# Altium footprint library PCB1.PcbLib: 54 footprints (part 1 of 4)
Each footprint in its own frame and in the unit in brackets; x right, y up, seen from the top. Pads: shape width x height; smd on the part's side, far side on the other; paste and mask are expansions set on the pad; w line width, h text height; cw(c..) or ccw(c..) is an arc to the next point about the centre after c.
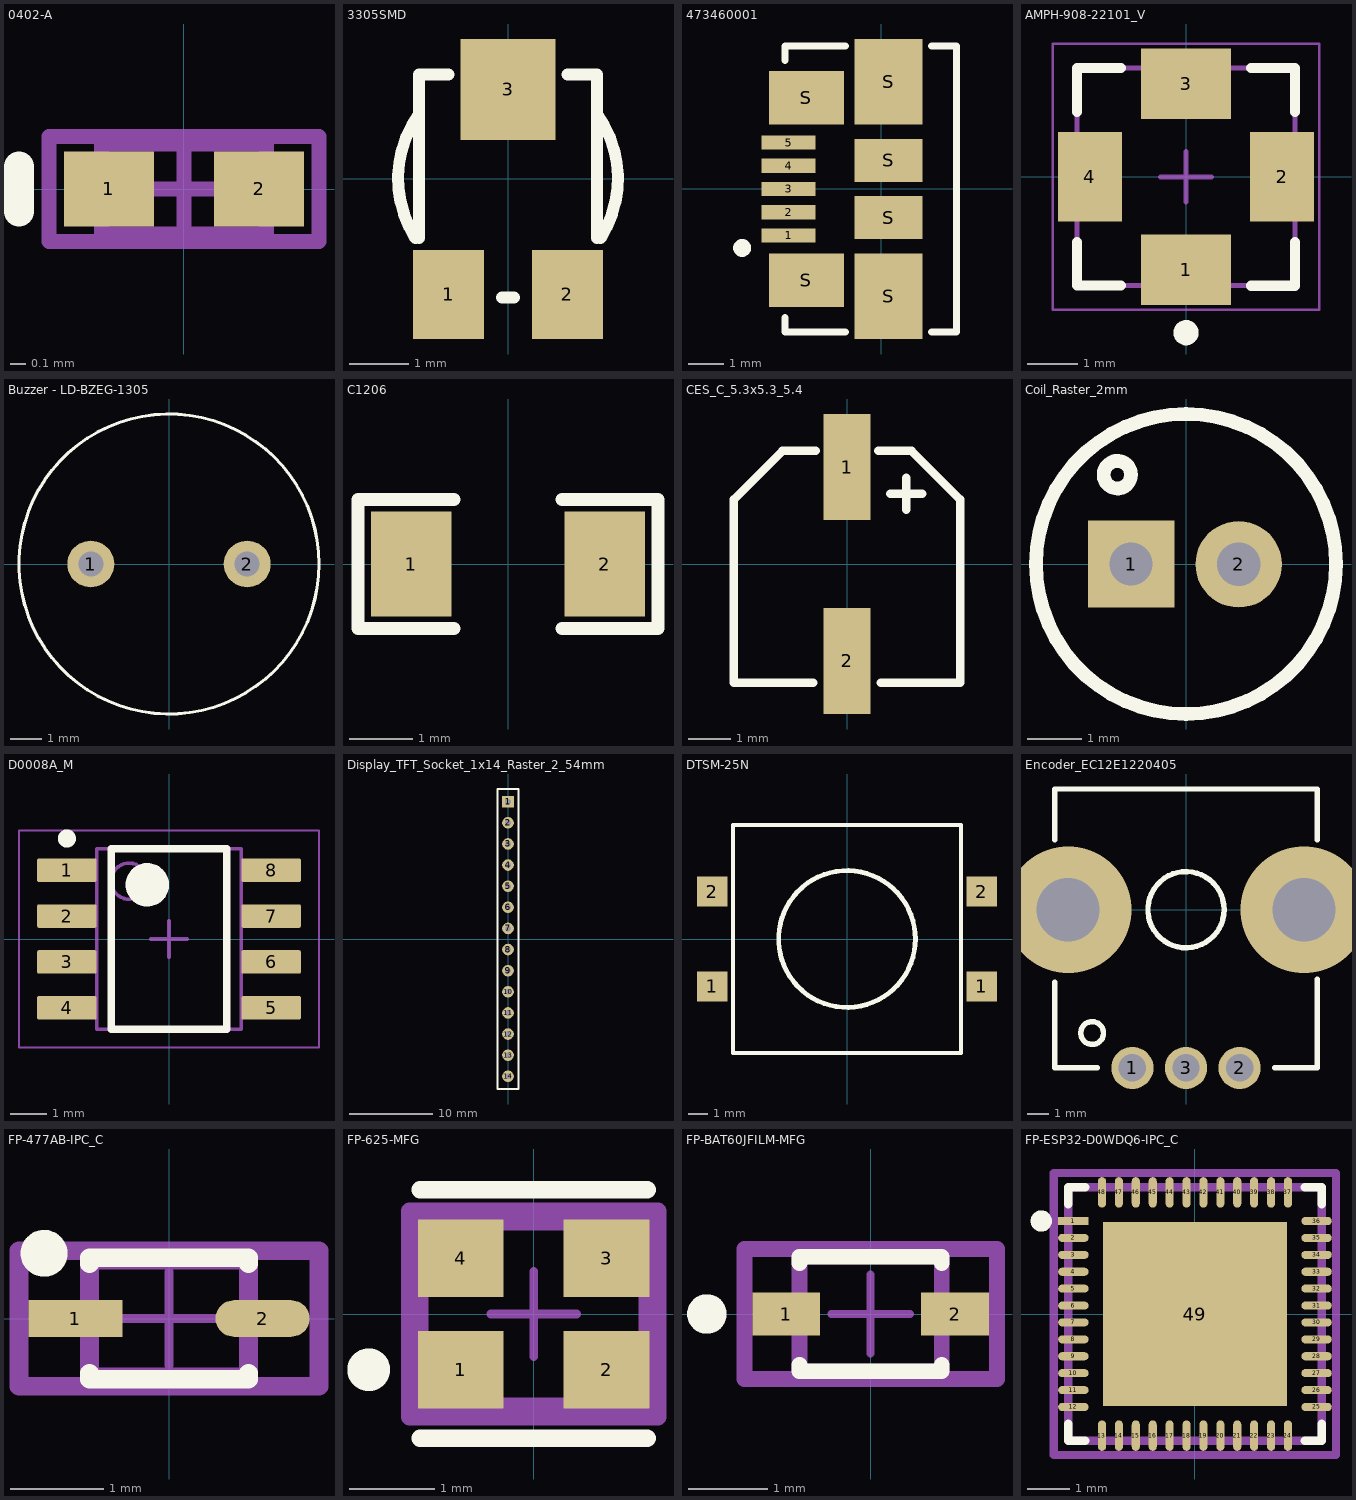
[diagram p0: the footprints below, top view; thin cyan lines are the x and y axes]

## 0402-A [mm]
pads (2):
  rect 0.6x0.5 smd: 1(-0.5,0) 2(0.5,0)
Top Overlay:
  lines w0.2: -1.1,-0.15 -1.1,0.15
Mechanical 13:
  lines w0.1: -0.55,-0.3 0.55,-0.3 0.55,0.3 -0.55,0.3 -0.55,-0.3
Mechanical 15:
  lines w0.1: -0.3,0 0.3,0 ; 0,-0.3 0,0.3 ; -0.9,-0.35 0.9,-0.35 0.9,0.35 -0.9,0.35 -0.9,-0.35
3D body: height 0.55, standoff 0, extent -0.55,-0.3 0.55,0.3

## 3305SMD [mm]
pads (3):
  rect 1.2x1.5 smd: 1(-1,-1.95) 2(1,-1.95)
  rect 1.6x1.7 smd: 3(0,1.5)
Top Overlay:
  lines w0.2: -1.558,-0.998 cw(c0,0) -1.504,1.078 ; -1.5,-1 -1.5,0.9 -1.5,1.75 -1,1.75 ; -0.1,-2 0.1,-2 ; 1,1.75 1.5,1.75 1.5,0.9 1.5,-1 ; 1.504,1.078 cw(c0,0) 1.558,-0.998
3D body: height 0.4, standoff 0, extent -1.5,-2 1.5,1.75
3D body: height 1.2, standoff 0.4, extent -1.85,-1.847 1.85,1.847

## 473460001 [mm]
pads (11):
  rect 1.5x0.4 smd: 1(-2.6,-1.3) 2(-2.6,-0.65) 3(-2.6,0) 4(-2.6,0.65) 5(-2.6,1.3)
  rect 2.1x1.5 smd: S(-2.1,-2.55) S(-2.1,2.55)
  rect 1.9x2.4 smd: S(0.2,-3) S(0.2,3)
  rect 1.9x1.2 smd: S(0.2,-0.8) S(0.2,0.8)
Top Overlay:
  circle w0.25: c-3.9,-1.65 r0.125
  lines w0.2: -2.7,-3.6 -2.7,-4 -1,-4 ; -2.7,3.6 -2.7,4 -1,4 ; 1.4,-4 2.1,-4 2.1,4 1.4,4
Mechanical 1:
  lines w0.1: 2.1,-4 2.1,4
  text "PCB Edge" at 3.1,-3.1 h0.8
3D body "473460001.stp": height 2.72, standoff -0.22, extent -2.65,-3.99 2.78,3.99

## AMPH-908-22101_V [mil]
pads (4):
  rect 70x55 smd paste-39.37: 1(0,-72.5) 3(0,72.5)
  rect 50x70 smd paste-39.37: 2(75,0) 4(-75,0)
Top Overlay:
  circle w9.84: c0,-121.65 r4.92
  lines w7.87: -85.04,-50.75 -85.04,-84.96 -50.75,-84.96 ; -84.99,50.75 -84.99,85 -50.75,85 ; 50.75,-85.04 84.96,-85.04 84.96,-50.75 ; 50.75,85 85,85 85,50.75
Mechanical 13:
  lines w3.94: -85,-85 -85,85 85,85 85,-85 -85,-85
Mechanical 15:
  lines w1.97: -103.92,-103.94 -103.92,103.94 103.92,103.94 103.92,-103.94 -103.92,-103.94
  lines w3.94: -19.68,0 19.68,0 ; 0,-19.68 0,19.68
3D body "908-22101.stp": height 142.56, standoff 0.5, extent -84.99,-84.99 85.05,85

## Buzzer - LD-BZEG-1305 [mm]
pads (2):
  round 1.5 hole 0.8 paste+0 mask+0.03: 1(-2.5,0) 2(2.5,0)
Top Overlay:
  circle w0.1: c0,0 r4.8
3D body: height 5, standoff 0, extent -4.8,-4.797 4.8,4.797
3D body: height 0.4, standoff -1, extent 2.102,-0.399 2.898,0.399
3D body: height 0.4, standoff -1, extent -2.898,-0.399 -2.102,0.399

## C1206 [mil]
pads (2):
  rect 50x65 smd: 1(-60,0) 2(60,0)
Top Overlay:
  lines w7.87: -33.46,-40 -93,-40 -93,40 -33.46,40 ; 33.46,-40 92.91,-40 92.91,40 33.46,40
3D body "User Library-1206 SMD Capacitor.step": height 39.45, standoff 0, extent -62.99,-31.49 63,31.5

## CES_C_5.3x5.3_5.4 [mm]
pads (2):
  rect 1.1x2.5 smd: 1(0,2.286) 2(0,-2.286)
Top Overlay:
  lines w0.2: -0.8,-2.794 -2.667,-2.794 -2.667,1.524 -1.524,2.667 -0.742,2.667 ; 0.742,2.667 1.524,2.667 2.667,1.524 2.667,-2.794 0.8,-2.794 ; 1.024,1.651 1.778,1.651 ; 1.397,1.278 1.397,2.032
3D body "User Library-ALU-C.STEP": height 5.41, standoff 0, extent -2.65,-2.95 2.65,2.95

## Coil_Raster_2mm [mm]
pads (2):
  rect 1.6x1.6 hole 0.8: 1(-1.016,0)
  round 1.6 hole 0.8: 2(0.974,-0.005)
Top Overlay:
  circle w0.254: c-1.27,1.651 r0.254
  circle w0.254: c0,0 r2.774
3D body: height 0, standoff -16, extent 0.649,-0.33 1.299,0.32
3D body: height 0, standoff -16, extent -1.341,-0.325 -0.691,0.325
3D body: height 7.5, standoff 0, extent -2.794,-0.572 -2.667,0.826
3D body: height 7.5, standoff 0, extent -2.75,-2.75 2.75,2.75

## D0008A_M [mm]
pads (8):
  rrect15% 1.65x0.65 smd: 1(-2.825,1.905) 2(-2.825,0.635) 3(-2.825,-0.635) 4(-2.825,-1.905) 5(2.825,-1.905) 6(2.825,-0.635) 7(2.825,0.635) 8(2.825,1.905)
Top Overlay:
  circle w0.25: c-2.825,2.78 r0.125
  circle w0.6: c-0.6,1.5 r0.3
  lines w0.2: -1.6,-2.5 -1.6,2.5 1.6,2.5 1.6,-2.5 -1.6,-2.5
Mechanical 1:
  text ".Designator" at -1.397,-0.254 h0.6
Mechanical 13:
  circle w0.1: c-1.1,1.6 r0.5
  lines w0.1: -2,-2.5 -2,2.5 2,2.5 2,-2.5 -2,-2.5
Mechanical 15:
  lines w0.05: -4.15,-3 -4.15,3 4.15,3 4.15,-3 -4.15,-3
  lines w0.1: -0.5,0 0.5,0 ; 0,-0.5 0,0.5
3D body "SOIC-8akaD0008AakaM08A.stp": height 1.63, standoff 0, extent -3,-2.45 3,2.45

## Display_TFT_Socket_1x14_Raster_2_54mm [mm]
pads (14):
  rect 1.4x1.4 hole 0.7: 1(0,16.51)
  round 1.4 hole 0.7: 2(0,13.97) 3(0,11.43) 4(0,8.89) 5(0,6.35) 6(0,3.81) 7(0,1.27) 8(0,-1.27) 9(0,-3.81) 10(0,-6.35) 11(0,-8.89) 12(0,-11.43) 13(0,-13.97) 14(0,-16.51)
Top Overlay:
  lines w0.254: -1.27,-18.034 1.27,-18.034 1.27,18.034 -1.27,18.034 -1.27,-18.034
3D body: height 8.5, standoff 0, extent -1.27,14.859 1.27,15.621
3D body: height 8.5, standoff 0, extent -1.27,12.319 1.27,13.081
3D body: height 8.5, standoff 0, extent -1.27,9.779 1.27,10.541
3D body: height 8.5, standoff 0, extent -1.27,7.239 1.27,8.001
3D body: height 8.5, standoff 0, extent -1.27,4.699 1.27,5.461
3D body: height 8.5, standoff 0, extent -1.27,2.159 1.27,2.921
3D body: height 8.5, standoff 0, extent -1.27,-0.381 1.27,0.381
3D body: height 8.5, standoff 0, extent -1.27,-2.921 1.27,-2.159
3D body: height 8.5, standoff 0, extent -1.27,-5.461 1.27,-4.699
3D body: height 8.5, standoff 0, extent -1.27,-8.001 1.27,-7.239
3D body: height 8.5, standoff 0, extent -1.27,-10.541 1.27,-9.779
3D body: height 8.5, standoff 0, extent -1.27,-13.081 1.27,-12.319
3D body: height 8.5, standoff 0, extent -1.27,-15.621 1.27,-14.859
3D body: height 0.5, standoff 0, extent -1.27,-18.034 1.27,18.034
3D body: height 8.5, standoff 0, extent -1.27,-18.034 1.27,-17.272
3D body: height 8.5, standoff 0, extent -1.27,17.399 1.27,18.034
3D body: height 8.5, standoff 0, extent -1.27,-18.034 -0.635,18.034
3D body: height 8.5, standoff 0, extent 0.635,-18.034 1.27,18.034
3D body: height 0, standoff -3, extent -0.4,-16.91 0.4,-16.11
3D body: height 0, standoff -3, extent -0.4,-14.37 0.4,-13.57
3D body: height 0, standoff -3, extent -0.4,-11.83 0.4,-11.03
3D body: height 0, standoff -3, extent -0.4,-9.29 0.4,-8.49
3D body: height 0, standoff -3, extent -0.4,-6.75 0.4,-5.95
3D body: height 0, standoff -3, extent -0.4,-4.21 0.4,-3.41
3D body: height 0, standoff -3, extent -0.4,-1.67 0.4,-0.87
3D body: height 0, standoff -3, extent -0.4,3.41 0.4,4.21
3D body: height 0, standoff -3, extent -0.4,5.95 0.4,6.75
3D body: height 0, standoff -3, extent -0.4,8.49 0.4,9.29
3D body: height 0, standoff -3, extent -0.4,11.03 0.4,11.83
3D body: height 0, standoff -3, extent -0.4,13.57 0.4,14.37
3D body: height 0, standoff -3, extent -0.4,16.11 0.4,16.91

## DTSM-25N [mm]
pads (4):
  rect 1.6x1.6 smd: 1(-7.1,-2.5) 1(7.1,-2.5) 2(-7.1,2.5) 2(7.1,2.5)
Top Overlay:
  circle w0.254: c0,0 r3.601
  lines w0.229: -6,-6 -6,6 6,6 6,-6 -6,-6
3D body "Diptronics_DTSM25_BROWN.STEP": height 8.5, standoff 0, extent -7.5,-6 7.5,6

## Encoder_EC12E1220405 [mm]
pads (3):
  round 2 hole 1.3: 1(-2.54,-7.493) 2(2.54,-7.493) 3(0,-7.493)
via -5.588,0 diameter 6 hole 3
via 5.588,0 diameter 6 hole 3
Top Overlay:
  circle w0.254: c0,0 r1.805
  circle w0.254: c-4.445,-5.842 r0.539
  lines w0.254: -6.223,-3.429 -6.223,-7.493 -4.191,-7.493 ; -6.223,3.302 -6.223,5.715 -1.778,5.715 6.223,5.715 6.223,3.302 ; 4.191,-7.493 6.223,-7.493 6.223,-3.302
3D body "ec12e1220405.stp": height 24.7, standoff -3.8, extent -6.996,-7.65 6.996,6.6

## FP-477AB-IPC_C [mm]
pads (2):
  rect 1.006x0.392 smd paste+0 mask+0: 1(-1,0)
  rrect100% 1.006x0.392 smd paste+0 mask+0: 2(1,0)
Top Overlay:
  circle w0.25: c-1.335,0.696 r0.125
  lines w0.2: -0.85,-0.585 -0.85,-0.65 0.85,-0.65 0.85,-0.585 ; -0.85,0.585 -0.85,0.65 0.85,0.65 0.85,0.585
Top 3D Body:
  lines w0.2: -0.85,-0.625 -0.85,0.625 0.85,0.625 0.85,-0.625 -0.85,-0.625
Top Courtyard:
  lines w0.2: -1.603,-0.725 -1.603,0.725 1.603,0.725 1.603,-0.725 -1.603,-0.725
Top Assembly:
  lines w0.2: -1.603,-0.725 -1.603,0.725 1.603,0.725 1.603,-0.725 -1.603,-0.725
  text ".Designator" at 0,0.188 h1
Top Component Center:
  lines w0.1: -0.5,0 0.5,0 ; 0,-0.5 0,0.5
3D body "Diode_ON_Semiconductor_1N4148WS_eec.STEP": height 0.25, standoff 0, extent -1.603,-0.725 1.603,0.725

## FP-625-MFG [mm]
pads (4):
  rect 1x0.9 smd paste+0 mask+0: 1(-0.85,-0.65) 2(0.85,-0.65) 3(0.85,0.65) 4(-0.85,0.65)
Top Overlay:
  circle w0.25: c-1.925,-0.65 r0.125
  lines w0.2: -1.325,-1.45 1.325,-1.45 ; -1.325,1.45 1.325,1.45
Top 3D Body:
  lines w0.2: -1.325,-1.075 -1.325,1.075 1.325,1.075 1.325,-1.075 -1.325,-1.075
Top Courtyard:
  lines w0.2: -1.45,-1.2 -1.45,1.2 1.45,1.2 1.45,-1.2 -1.45,-1.2
Top Assembly:
  lines w0.2: -1.45,-1.2 -1.45,1.2 1.45,1.2 1.45,-1.2 -1.45,-1.2
  text ".Designator" at 0,0.188 h1
Top Component Center:
  lines w0.1: -0.5,0 0.5,0 ; 0,-0.5 0,0.5
3D body "Crys_CTS_Components_625L3C040M00000_eec.STEP": height 0.25, standoff 0, extent -1.45,-1.2 1.45,1.2

## FP-BAT60JFILM-MFG [mm]
pads (2):
  rect 0.86x0.54 smd paste+0 mask+0: 1(-1.07,0) 2(1.07,0)
Top Overlay:
  circle w0.25: c-2.075,0 r0.125
  lines w0.2: -0.9,-0.645 -0.9,-0.725 0.9,-0.725 0.9,-0.645 ; -0.9,0.645 -0.9,0.725 0.9,0.725 0.9,0.645
Top 3D Body:
  lines w0.2: -0.9,-0.725 0.9,-0.725 0.9,0.725 -0.9,0.725 -0.9,-0.725
Top Courtyard:
  lines w0.2: -1.6,-0.825 1.6,-0.825 1.6,0.825 -1.6,0.825 -1.6,-0.825
Top Assembly:
  lines w0.2: -1.6,-0.825 1.6,-0.825 1.6,0.825 -1.6,0.825 -1.6,-0.825
  text ".Designator" at 0,0.188 h1
Top Component Center:
  lines w0.1: -0.5,0 0.5,0 ; 0,-0.5 0,0.5
3D body "Diode_STMicroelectronics_BAT60JFILM_eec.STEP": height 0.25, standoff 0, extent -1.6,-0.825 1.6,0.825

## FP-ESP32-D0WDQ6-IPC_C [mm]
pads (49):
  rect 0.718x0.192 smd paste+0 mask+0: 1(-2.877,2.2)
  rrect100% 0.718x0.192 smd paste+0 mask+0: 2(-2.877,1.8) 3(-2.877,1.4) 4(-2.877,1) 5(-2.877,0.6) 6(-2.877,0.2) 7(-2.877,-0.2) 8(-2.877,-0.6) 9(-2.877,-1) 10(-2.877,-1.4) 11(-2.877,-1.8) 12(-2.877,-2.2) 25(2.877,-2.2) 26(2.877,-1.8) 27(2.877,-1.4) 28(2.877,-1) 29(2.877,-0.6) 30(2.877,-0.2) 31(2.877,0.2) 32(2.877,0.6) 33(2.877,1) 34(2.877,1.4) 35(2.877,1.8) 36(2.877,2.2)
  rrect100% 0.192x0.718 smd paste+0 mask+0: 13(-2.2,-2.877) 14(-1.8,-2.877) 15(-1.4,-2.877) 16(-1,-2.877) 17(-0.6,-2.877) 18(-0.2,-2.877) 19(0.2,-2.877) 20(0.6,-2.877) 21(1,-2.877) 22(1.4,-2.877) 23(1.8,-2.877) 24(2.2,-2.877) 37(2.2,2.877) 38(1.8,2.877) 39(1.4,2.877) 40(1,2.877) 41(0.6,2.877) 42(0.2,2.877) 43(-0.2,2.877) 44(-0.6,2.877) 45(-1,2.877) 46(-1.4,2.877) 47(-1.8,2.877) 48(-2.2,2.877)
  rect 4.35x4.35 smd paste-1000 mask+0: 49(0,0)
Top Overlay:
  circle w0.25: c-3.636,2.2 r0.125
  lines w0.2: -3,-2.6 -3,-3 -2.6,-3 ; -3,2.6 -3,3 -2.6,3 ; 2.6,-3 3,-3 3,-2.6 ; 2.6,3 3,3 3,2.6
Top Paste:
  rectangle: -1.376,-1.374 1.376,1.377
Top 3D Body:
  lines w0.2: -3,-3 3,-3 3,3 -3,3 -3,-3
Top Courtyard:
  lines w0.2: -3.336,-3.336 3.336,-3.336 3.336,3.336 -3.336,3.336 -3.336,-3.336
Top Assembly:
  lines w0.2: -3.336,-3.336 3.336,-3.336 3.336,3.336 -3.336,3.336 -3.336,-3.336
  text ".Designator" at 0,-0.001 h1
Top Component Center:
  lines w0.1: -0.5,0 0.5,0 ; 0,-0.5 0,0.5
3D body "IC_Espressif_Systems_ESP32-D0WDQ6_eec.STEP": height 0.25, standoff 0, extent -3.336,-3.336 3.336,3.336